# Altium footprint library Mylib.PcbLib: 320 footprints (part 18 of 20)
Each footprint in its own frame and in the unit in brackets; x right, y up, seen from the top. Pads: shape width x height; smd on the part's side, far side on the other; paste and mask are expansions set on the pad; w line width, h text height; cw(c..) or ccw(c..) is an arc to the next point about the centre after c.
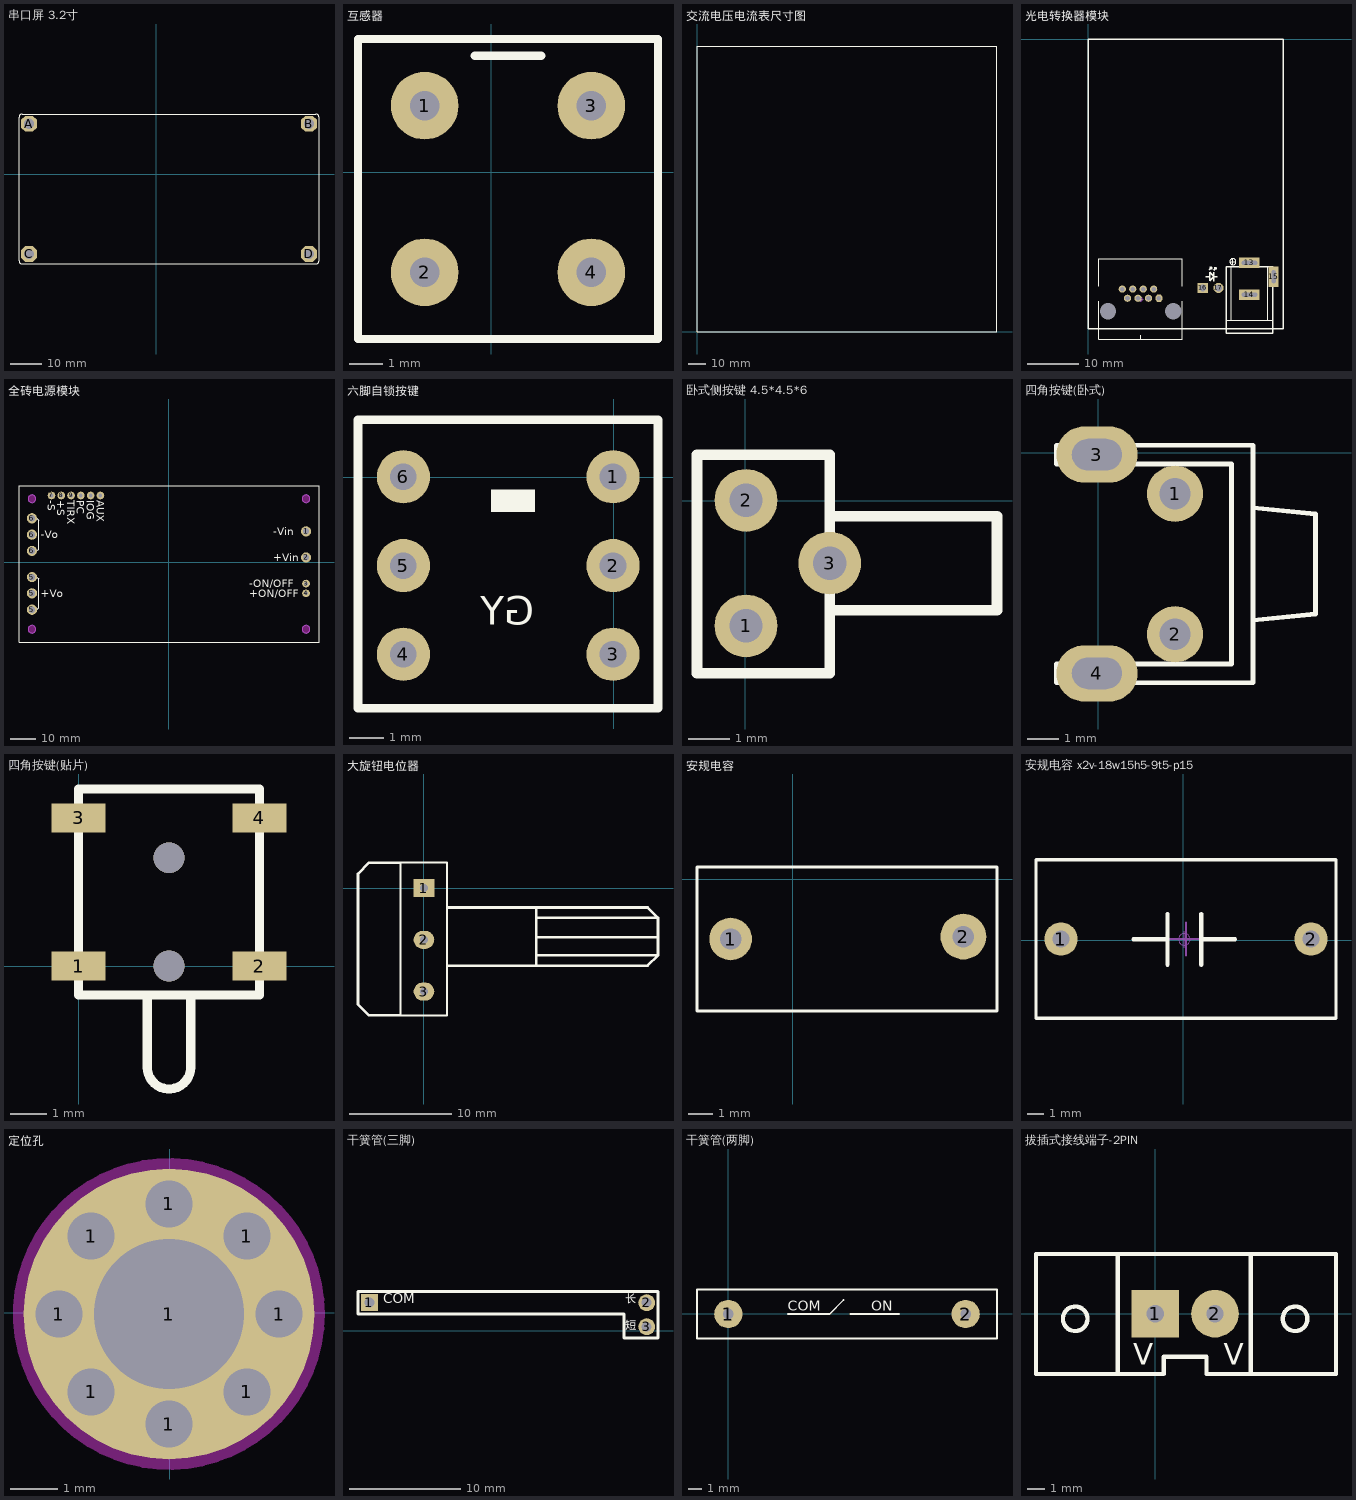
[diagram p17: the footprints below, top view; thin cyan lines are the x and y axes]

## 串口屏 3.2寸 [mm]
pads (4):
  oct 5x5 hole 3.2: A(-40.3,15.9) B(48.3,15.9) C(-40.3,-25.3) D(48.3,-25.3)
Top Overlay:
  lines w0.127: -43.5,-27.5 ccw(c-42.5,-27.5) -42.5,-28.5 50.5,-28.5 ccw(c50.5,-27.5) 51.5,-27.5 51.5,18 ccw(c50.5,18) 50.5,19 -42.5,19 ccw(c-42.5,18) -43.5,18 -43.5,-27.5

## 互感器 [mil]
pads (4):
  round 80 hole 35: 1(-78.74,78.74) 2(-78.74,-118.11) 3(118.11,78.74) 4(118.11,-118.11)
Top Overlay:
  lines w10: -19.68,137.8 59.06,137.8 ; -157.48,-196.85 196.85,-196.85 196.85,157.48 -157.48,157.48 -157.48,-196.85

## 交流电压电流表尺寸图 [mm]
Top Overlay:
  lines w0.254: -0.004,159.995 167.996,159.995 167.996,-0.005 ; 0,160 0,0 168,0

## 光电转换器模块 [mm]
pads (15):
  oct 1.4x1.4 hole 0.9: 1(13.791,-50.523)
  round 1.4 hole 0.9: 2(12.771,-48.743) 3(11.751,-50.523) 4(10.731,-48.743) 5(9.711,-50.523) 6(8.691,-48.743) 7(7.671,-50.523) 8(6.651,-48.743)
  round 0 hole 3.2 unplated: 9(3.871,-53.076) 10(16.571,-53.076)
  rect 4x2 hole 0.8 slot 3 at 0 deg: 13(31.437,-43.624) 14(31.437,-49.824)
  rect 2x4 hole 0.8 slot 2.5 at 90 deg: 15(36.137,-46.324)
  rect 2x2 hole 1.3 unplated: 16(22.352,-48.514)
  round 2 hole 1.3 unplated: 17(25.4,-48.514)
Top Overlay:
  circle w0.127: c28.203,-43.396 r0.604
  lines w0.127: 27.67,-43.396 28.686,-43.396 ; 28.178,-43.904 28.178,-42.888
  lines w0.2: 26.937,-54.824 35.937,-54.824 ; 27.881,-54.824 27.881,-44.34 ; 34.993,-54.824 34.993,-44.34
  lines w0.203: 2.093,-56.339 18.349,-56.339 ; 2.093,-51.094 2.093,-58.46 18.349,-58.46 18.349,-51.094 ; 2.093,-48.173 2.093,-42.839 18.349,-42.839 18.349,-48.173 ; 10.221,-58.46 10.221,-57.698 ; 18.349,-48.173 18.349,-48.173
  lines w0.254: 22.893,-46.291 23.683,-46.291 ; 23.556,-44.958 24.064,-44.45 ; 23.683,-44.45 24.064,-44.45 ; 24.064,-44.831 24.064,-44.45 ; 24.445,-47.244 24.445,-45.466 ; 24.445,-46.304 25.146,-46.304 ; 24.445,-45.085 24.953,-44.577 ; 24.572,-44.577 24.953,-44.577 ; 24.953,-44.831 24.953,-44.577 ; 38,-56.5 0,-56.5 0,0 38,0 38,-56.5 ; 38,-56.5 38,-56.5 ; 23.683,-47.117 24.445,-46.355 24.445,-46.228 23.683,-45.466 23.683,-47.117 ; 26.937,-57.324 26.937,-44.34 35.937,-44.34 35.937,-57.324 26.937,-57.324
Mechanical 15:
  circle w0.05: c10.221,-50.713 r0.35
  lines w0.05: 9.721,-50.713 10.721,-50.713 ; 10.221,-51.213 10.221,-50.213
3D body "SOP24.STEP": height 4.3, standoff 1.6, extent 2.646,-39.646 18.046,-29.34
3D body: height 8, standoff 1.6, extent 6.651,-26 31.651,12
3D body: height 1.6, standoff 0, extent 0,-56.5 38,0

## 全砖电源模块 [mm]
pads (16):
  round 4 hole 2.5: 1(53.508,12.06) 2(53.508,1.9) 5(-53.182,-18.42) 5(-53.182,-12.07) 5(-53.182,-5.72) 6(-53.192,4.44) 6(-53.192,10.79) 6(-53.192,17.14)
  round 3 hole 1.4: 3(53.508,-8.26) 4(53.508,-12.07) 7(-45.592,26.03) 8(-41.782,26.03) 9(-37.972,26.03) 10(-34.162,26.03) 11(-30.352,26.03) 12(-26.542,26.03)
Top Overlay:
  lines w0.254: -51.277,-18.42 -50.525,-17.668 -50.525,-6.472 -51.277,-5.72 ; -51.266,4.44 -50.514,5.192 -50.514,16.388 -51.266,17.14 ; -58.242,-31.14 -58.242,29.86 58.558,29.86 58.558,-31.14 -58.242,-31.14
  text "+Vo" at -49.693,-13.57 h3
  text "-Vo" at -49.693,9.29 h3
  text "-S" at -47.092,24.105 h3
  text "+S" at -43.282,24.105 h3
  text "TIRX" at -39.472,24.105 h3
  text "PC" at -35.662,24.105 h3
  text "IOG" at -31.852,24.105 h3
  text "AUX" at -28.042,24.105 h3
  text "+ON/OFF" at 31.333,-13.57 h3
  text "-ON/OFF" at 31.333,-9.76 h3
  text "+Vin" at 40.83,0.4 h3
  text "-Vin" at 40.83,10.56 h3
Keep-Out Layer:
  board cut-out: 53.508,-27.54 53.656,-27.54 53.945,-27.483 54.218,-27.37 54.464,-27.206 54.673,-26.997 54.837,-26.751 54.95,-26.478 55.008,-26.188 55.008,-26.04 55.008,-25.893 54.95,-25.603 54.837,-25.33 54.673,-25.084 54.464,-24.875 54.218,-24.711 53.945,-24.598 53.656,-24.54 53.508,-24.54 53.36,-24.54 53.07,-24.598 52.797,-24.711 52.552,-24.875 52.343,-25.084 52.179,-25.33 52.065,-25.603 52.008,-25.893 52.008,-26.04 52.008,-26.188 52.065,-26.478 52.179,-26.751 52.343,-26.997 52.552,-27.206 52.797,-27.37 53.07,-27.483 53.36,-27.54
  board cut-out: 53.508,23.26 53.656,23.26 53.945,23.317 54.218,23.43 54.464,23.594 54.673,23.803 54.837,24.049 54.95,24.322 55.008,24.612 55.008,24.76 55.008,24.907 54.95,25.197 54.837,25.47 54.673,25.716 54.464,25.925 54.218,26.089 53.945,26.202 53.656,26.26 53.508,26.26 53.36,26.26 53.07,26.202 52.797,26.089 52.552,25.925 52.343,25.716 52.179,25.47 52.065,25.197 52.008,24.907 52.008,24.76 52.008,24.612 52.065,24.322 52.179,24.049 52.343,23.803 52.552,23.594 52.797,23.43 53.07,23.317 53.36,23.26
  board cut-out: -51.692,24.76 -51.692,24.612 -51.75,24.322 -51.863,24.049 -52.027,23.803 -52.236,23.594 -52.482,23.43 -52.755,23.317 -53.044,23.26 -53.192,23.26 -53.34,23.26 -53.63,23.317 -53.903,23.43 -54.148,23.594 -54.357,23.803 -54.521,24.049 -54.635,24.322 -54.692,24.612 -54.692,24.76 -54.692,24.907 -54.635,25.197 -54.521,25.47 -54.357,25.716 -54.148,25.925 -53.903,26.089 -53.63,26.202 -53.34,26.26 -53.192,26.26 -53.044,26.26 -52.755,26.202 -52.482,26.089 -52.236,25.925 -52.027,25.716 -51.863,25.47 -51.75,25.197 -51.692,24.907
  board cut-out: -51.692,-26.04 -51.692,-26.188 -51.75,-26.478 -51.863,-26.751 -52.027,-26.997 -52.236,-27.206 -52.482,-27.37 -52.755,-27.483 -53.044,-27.54 -53.192,-27.54 -53.34,-27.54 -53.63,-27.483 -53.903,-27.37 -54.148,-27.206 -54.357,-26.997 -54.521,-26.751 -54.635,-26.478 -54.692,-26.188 -54.692,-26.04 -54.692,-25.893 -54.635,-25.603 -54.521,-25.33 -54.357,-25.084 -54.148,-24.875 -53.903,-24.711 -53.63,-24.598 -53.34,-24.54 -53.192,-24.54 -53.044,-24.54 -52.755,-24.598 -52.482,-24.711 -52.236,-24.875 -52.027,-25.084 -51.863,-25.33 -51.75,-25.603 -51.692,-25.893
Mechanical 1:
  circle w0.254: c53.508,-26.04 r1.5
  circle w0.254: c53.508,24.76 r1.5
  circle w0.254: c-53.192,24.76 r1.5
  circle w0.254: c-53.192,-26.04 r1.5
3D body "全砖模块电源.step": height 12.7, standoff -5, extent -58.242,-31.14 58.558,29.86
3D body: height 0.25, standoff 0, extent 58.558,-31.14 58.558,-31.14
3D body: height 0.25, standoff 0, extent 12.33,-1.422 12.33,-1.422
3D body: height 0.25, standoff 0, extent 58.558,-31.14 58.558,-31.14
3D body: height 0.25, standoff 0, extent 58.558,-31.14 58.558,-31.14
3D body: height 0.25, standoff 0, extent 58.558,-31.14 58.558,-31.14

## 六脚自锁按键 [mil]
pads (6):
  round 60 hole 30: 1(-0.63,0.71) 2(-0.63,-99.29) 3(-0.63,-199.29) 4(-236.85,-199.29) 5(-236.85,-99.29) 6(-236.85,0.71)
Top Overlay:
  region: -88.43,-13.66 -138.43,-13.66 -138.43,-38.66 -88.43,-38.66
  lines w10: -288,-260 50,-260 50,65 -288,65 -288,-260
  text "GY" at -89.21,-176.46 h55
3D body "TL 2201.step": height 551.18, standoff -137.8, extent -287.32,-266 47.32,68.64

## 卧式侧按键 4.5*4.5*6 [mm] "卧式侧按键 4.5*4.5*6"
pads (3):
  round 1.5 hole 0.8: 1(0.022,-2.992) 2(0.022,0.008) 3(2.022,-1.492)
Top Overlay:
  lines w0.254: 2.022,-2.617 6.022,-2.617 6.022,-0.367 2.022,-0.367 ; -1.15,-4.125 2.022,-4.125 2.022,1.1 -1.15,1.1 -1.15,-4.125

## 四角按键(卧式) [mm] "轻触开关 卧式带支架"
pads (4):
  round 1.8 hole 1: 1(2.452,-1.308) 2(2.452,-5.808)
  oval 2.6x1.8 hole 1 slot 1.6 at 0 deg: 3(-0.048,-0.058) 4(-0.048,-7.058)
Top Overlay:
  lines w0.16: 1.452,-7.358 4.952,-7.358 ; 4.952,-5.358 6.952,-5.158 6.952,-1.958 4.952,-1.758 ; 4.952,-7.358 4.952,0.242 -1.348,0.242 -1.348,-0.358 4.252,-0.358 4.252,-6.758 -1.348,-6.758 -1.348,-7.358 4.952,-7.358

## 四角按键(贴片) [mm]
pads (4):
  rect 1.5x0.8 smd: 1(0,0) 2(5,0) 3(0,4.1) 4(5,4.1)
via 2.5,3 diameter 0.85 hole 0.85
via 2.5,0 diameter 0.85 hole 0.85
Top Overlay:
  lines w0.254: 1.9,-0.8 1.9,-2.8 ccw(c2.5,-2.8) 3.1,-2.8 3.1,-0.8 ; 0,-0.8 0,4.9 5,4.9 5,-0.8 0,-0.8
3D body: height 2.5, standoff 0, extent -1.079,-1.243 6.121,5.257

## 大旋钮电位器 [mil]
pads (3):
  rect 80x70 hole 30: 1(0,0)
  oval 80x70 hole 30: 2(0,-200) 3(0,-400)
Top Overlay:
  lines w7.87: -90,-492.13 -90,98.43 90,98.43 90,-492.13 -90,-492.13
  lines w10: -90,-492.13 -212.87,-492.13 -255,-450 -255,55 -211.57,98.43 -90,98.43 ; 90,-300 825,-300 ; 90,-75 865,-75 905,-115 ; 435,-300 435,-75 ; 435,-260 905,-260 ; 435,-190 900,-190 ; 435,-115 905,-115 ; 815,-300 865,-300 905,-260 ; 905,-260 905,-115

## 安规电容 [mm]
pads (2):
  round 1.778 hole 0.889: 1(-2.6,-2.5)
  round 1.905 hole 0.889: 2(7.1,-2.4)
Top Overlay:
  lines w0.127: -4,-5.5 -4,0.5 8.5,0.5 8.5,-5.5 -4,-5.5
3D body "Capacitor 10n - 630V.step": height 10.92, standoff -3, extent -4.155,-4.976 8.595,-0.225

## 安规电容 x2v-18w15h5-9t5-p15 [mm] "18w15h5-9t5-p15"
pads (2):
  round 2 hole 1: 1(-7.349,0.069) 2(7.651,0.069)
Top Overlay:
  lines w0.2: -8.849,-4.681 9.151,-4.681 9.151,4.824 -8.849,4.824 -8.849,-4.681
  lines w0.254: -2.997,0.051 -0.965,0.051 ; -0.965,-1.473 -0.965,1.575 ; 1.067,-1.473 1.067,1.575 ; 1.067,0.051 3.099,0.051
Mechanical 13:
  lines w0.05: -8.849,-4.681 9.151,-4.681 9.151,4.824 -8.849,4.824 -8.849,-4.681
Mechanical 15:
  circle w0.05: c0.051,0.051 r0.35
  lines w0.05: -0.449,0.051 0.551,0.051 ; 0.051,-0.449 0.051,0.551
  lines w0.1: -0.849,0.069 1.151,0.069 ; 0.151,-0.931 0.151,1.069
3D body "x2v-18w15h5-9t5-p15.stp": height 15.51, standoff -3.99, extent -8.849,-4.681 9.151,4.824

## 定位孔 [mm]
pads (9):
  round 1 hole 1: 1(-2.368,-0.023) 1(-1.679,-1.685) 1(-1.679,1.638) 1(-0.018,-2.373) 1(-0.018,2.327) 1(1.644,-1.685) 1(1.644,1.638) 1(2.332,-0.023)
  round 6.2 hole 3.2: 1(-0.018,-0.023)
Keep-Out Layer:
  circle w0.254: c-0.018,-0.023 r3.2

## 干簧管(三脚) [mil]
pads (3):
  rect 60x60 hole 35: 1(95,100)
  round 60 hole 35: 2(1075,100) 3(1075,15)
Top Overlay:
  lines w10: 55,60 995,60 995,-25 1115,-25 1115,140 55,140 55,60
  text "COM" at 145,85 h60
  text "短" at 1000,-5 h50
  text "长" at 1000,90 h50
3D body: height 44.97, standoff 5.03, extent 813.15,84.9 863.15,124.9
3D body: height 44.97, standoff 5.03, extent 368.15,84.89 418.15,124.89
3D body: height 69.95, standoff -9.95, extent 418.15,65 811.85,144.79

## 干簧管(两脚) [mil]
pads (2):
  round 80 hole 30: 1(0.98,-0.98) 2(670.28,-0.98)
Top Overlay:
  lines w5: 168.31,-0.98 286.42,-0.98 325.79,38.39 ; 345.47,-0.98 483.27,-0.98 ; -87.6,-69.88 -87.6,67.91 758.86,67.91 758.86,-69.88 -87.6,-69.88
  text "ON" at 404.53,-0.98 h50
  text "COM" at 168.31,-0.98 h50
3D body: height 69.92, standoff -9.92, extent 43.31,-40.31 633.86,39.37
3D body: height 44.97, standoff 5.03, extent -8.86,-20.98 41.14,19.02
3D body: height 44.97, standoff 5.03, extent 633.86,-20.47 683.86,19.53

## 拔插式接线端子-2PIN [mil]
pads (2):
  rect 110x110 hole 40: 1(0,0)
  round 110 hole 40: 2(137.8,0)
Top Overlay:
  circle w10: c-185.04,-11.81 r28.39
  circle w10: c322.83,-11.81 r28.39
  lines w10: -86.61,-139.32 -86.61,137.8 ; 220.47,-137.8 220.47,137.8 ; -275.59,-139.32 19.68,-139.32 19.68,-99.32 118.11,-99.32 118.11,-139.32 417.32,-139.32 417.32,137.8 -275.59,137.8 -275.59,-139.32
  text "V" at 157.48,-118.11 h50
  text "V" at -51.18,-118.11 h50
3D body: height 433.07, standoff -78.74, extent -129.92,-157.48 263.78,157.48